# Altium footprint library Pcb-hionyPcbLib.PcbLib: 580 footprints (part 34 of 37)
Each footprint in its own frame and in the unit in brackets; x right, y up, seen from the top. Pads: shape width x height; smd on the part's side, far side on the other; paste and mask are expansions set on the pad; w line width, h text height; cw(c..) or ccw(c..) is an arc to the next point about the centre after c.
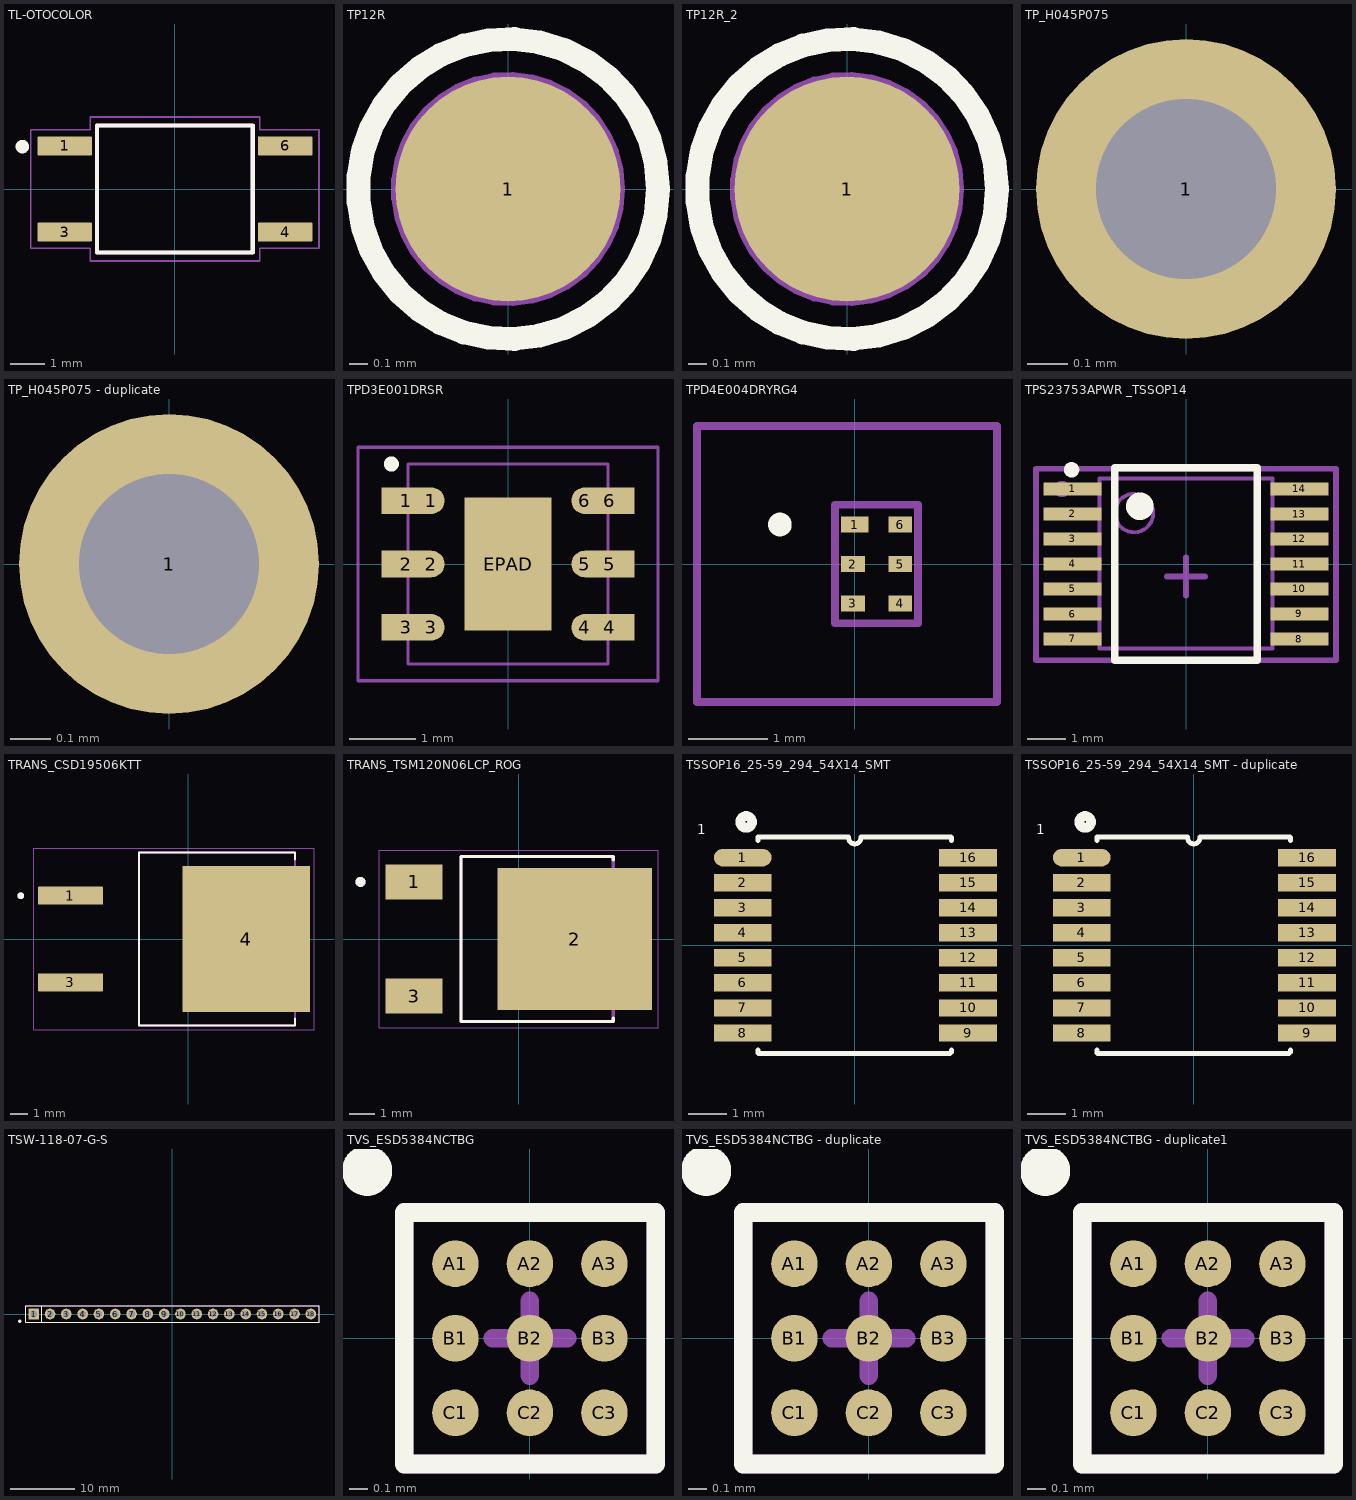
[diagram p33: the footprints below, top view; thin cyan lines are the x and y axes]

## TL-OTOCOLOR [mm]
pads (4):
  rrect14% 1.61x0.57 smd: 1(-3.25,1.27) 3(-3.25,-1.27) 4(3.25,-1.27) 6(3.25,1.27)
Top Overlay:
  circle w0.2: c-4.5,1.25 r0.1
  lines w0.127: -2.3,-1.875 2.3,-1.875 2.3,1.875 -2.3,1.875 -2.3,-1.875
Mechanical 13:
  circle w0.2: c-3.75,1.25 r0.1
  lines w0.127: -2.3,-1.875 2.3,-1.875 2.3,1.875 -2.3,1.875 -2.3,-1.875
Mechanical 15:
  lines w0.05: -4.25,-1.75 -2.5,-1.75 -2.5,-2.125 2.5,-2.125 2.5,-1.75 4.25,-1.75 4.25,1.75 2.5,1.75 2.5,2.125 -2.5,2.125 -2.5,1.75 -4.25,1.75 -4.25,-1.75
3D body "TLP185.step": height 2.2, standoff 0, extent -3.387,-1.9 3.641,1.9

## TP12R [mm]
pads (1):
  round 1.2 smd paste-10: 1(0,0)
Top Overlay:
  circle w0.127: c0,0 r0.8
Mechanical 11:
  text ".Designator" at 0,0 h0.5
Mechanical 13:
  circle w0.05: c0,0 r0.6
3D body: height 0.05, standoff 0, extent -0.6,-0.6 0.6,0.6

## TP12R_2 [mm]
pads (1):
  round 1.2 smd paste-10: 1(0,0)
Top Overlay:
  circle w0.127: c0,0 r0.8
Mechanical 11:
  text ".Designator" at 0.22,-0.575 h0.5
Mechanical 13:
  circle w0.05: c0,0 r0.6
3D body: height 0.05, standoff 0, extent -0.6,-0.6 0.6,0.6

## TP_H045P075 [mm]
pads (1):
  round 0.75 hole 0.45: 1(0,0)

## TP_H045P075 - duplicate [mm]
pads (1):
  round 0.75 hole 0.45: 1(0,0)

## TPD3E001DRSR [mm]
pads (13):
  rect 0.75x0.4 smd paste-0.025 mask+0.07: 1(-1.525,0.95) 2(-1.525,0) 3(-1.525,-0.95) 4(1.525,-0.95) 5(1.525,0) 6(1.525,0.95)
  round 0.4 smd paste-0.025 mask+0.07: 1(-1.15,0.95) 2(-1.15,0) 3(-1.15,-0.95) 4(1.15,-0.95) 5(1.15,0) 6(1.15,0.95)
  rect 1.3x2 smd paste-0.15 mask+0.05: EPAD(0,0)
Top Overlay:
  circle w0.127: c-1.75,1.5 r0.05
Mechanical 11:
  text ".Designator" at -1.27,0 h0.5
Mechanical 13:
  circle w0.05: c-1.15,0.95 r0.16
  lines w0.05: -1.5,-1.5 1.5,-1.5 1.5,1.5 -1.5,1.5 -1.5,-1.5
Mechanical 15:
  lines w0.05: -0.25,0 0.25,0 ; 0,-0.25 0,0.25 ; 0,-0.1 0,0.1 ; -2.25,-1.75 2.25,-1.75 2.25,1.75 -2.25,1.75 -2.25,-1.75
3D body "User Library-WSON-6.step": height 0.76, standoff 0.01, extent -1.51,-1.5 1.51,1.5

## TPD4E004DRYRG4 [mm]
pads (6):
  rect 0.35x0.2 smd: 1(0,0.5)
  rect 0.3x0.2 smd: 2(-0.025,0) 3(-0.025,-0.5) 4(0.575,-0.5) 5(0.575,0) 6(0.575,0.5)
Top Overlay:
  lines w0.2: -1,0.5 ccw(c-0.95,0.5) -0.9,0.5 ; -1,0.5 cw(c-0.95,0.5) -0.9,0.5 ; -1,0.5 ccw(c-0.95,0.5) -0.9,0.5
Mechanical 13:
  lines w0.1: -0.25,-0.75 -0.25,0.75 0.8,0.75 0.8,-0.75 -0.25,-0.75
Mechanical 15:
  lines w0.1: -2,-1.75 -2,1.75 1.8,1.75 1.8,-1.75 -2,-1.75
3D body "TPD4E004DRYRG4.stp": height 0.7, standoff 0, extent -0.25,-0.75 0.8,0.75

## TPS23753APWR _TSSOP14 [mm]
pads (14):
  rect 1.5x0.35 smd: 1(-2.95,1.95) 2(-2.95,1.3) 3(-2.95,0.65) 4(-2.95,0) 5(-2.95,-0.65) 6(-2.95,-1.3) 7(-2.95,-1.95) 8(2.95,-1.95) 9(2.95,-1.3) 10(2.95,-0.65) 11(2.95,0) 12(2.95,0.65) 13(2.95,1.3) 14(2.95,1.95)
Top Overlay:
  circle w0.25: c-2.975,2.45 r0.075
  circle w0.6: c-1.2,1.5 r0.056
  lines w0.2: -1.85,-2.5 -1.85,2.5 1.85,2.5 1.85,-2.5 -1.85,-2.5
Mechanical 13:
  circle w0.1: c-1.35,1.325 r0.5
  lines w0.1: -2.25,-2.2 -2.25,2.225 2.25,2.225 2.25,-2.2 -2.25,-2.2
Mechanical 15:
  circle w0.35: c-3.225,1.95 r0.035
  lines w0.15: -0.5,-0.325 0.5,-0.325 ; 0,-0.825 0,0.175 ; -3.9,-2.5 -3.9,2.475 3.9,2.475 3.9,-2.5 -3.9,-2.5
  text ".Designator" at -0.729,0.539 h0.55
3D body "User Library-TSSOP14-1.step": height 1.1, standoff 0, extent -3.2,-2.5 3.2,2.5

## TRANS_CSD19506KTT [mm]
height 4.7
pads (3):
  rrect10% 3.82x1.05 smd mask+0: 1(-6.9,2.54) 3(-6.9,-2.54)
  rect 7.48x8.55 smd paste-5 mask+0.07: 4(3.4,0)
Top Overlay:
  circle w0.2: c-9.81,2.54 r0.1
  lines w0.127: 6.265,-4.665 6.265,-5.08 -2.885,-5.08 -2.885,5.08 6.265,5.08 6.265,4.665
Top Paste:
  drawing of 42 lines, arcs and shapes, not listed
Top Solder:
  drawing of 2 lines, arcs and shapes, not listed
Mechanical 13:
  circle w0.2: c-9.81,2.54 r0.1
  lines w0.127: -2.885,-5.08 6.265,-5.08 6.265,5.08 -2.885,5.08 -2.885,-5.08
Mechanical 15:
  lines w0.05: -9.06,-5.33 -9.06,5.33 7.39,5.33 7.39,-5.33 -9.06,-5.33
3D body "CSD19506KTT.STEP": height 4.7, standoff -0.25, extent -7.607,-5.08 7.493,5.08

## TRANS_TSM120N06LCP_ROG [mm]
height 2.4
pads (3):
  rect 2.29x1.4 smd: 1(-4.19,2.285) 3(-4.19,-2.285)
  rect 6.18x5.69 smd paste-4: 2(2.245,0)
Top Overlay:
  circle w0.2: c-6.335,2.285 r0.1
  lines w0.127: 3.795,-3.165 3.795,-3.3 -2.305,-3.3 -2.305,3.3 3.795,3.3 3.795,3.165
Top Paste:
  region: 4.97,-2.305 3.64,-2.305 3.64,-0.545 4.97,-0.545
  region: 2.91,-2.305 1.58,-2.305 1.58,-0.545 2.91,-0.545
  region: 0.85,-2.305 -0.48,-2.305 -0.48,-0.545 0.85,-0.545
  region: 0.85,0.545 -0.48,0.545 -0.48,2.305 0.85,2.305
  region: 4.97,0.545 3.64,0.545 3.64,2.305 4.97,2.305
  region: 2.91,0.545 1.58,0.545 1.58,2.305 2.91,2.305
Mechanical 13:
  circle w0.2: c-6.335,2.285 r0.1
  lines w0.127: -2.305,-3.3 3.795,-3.3 3.795,3.3 -2.305,3.3 -2.305,-3.3
Mechanical 15:
  lines w0.05: -5.585,-3.55 5.585,-3.55 5.585,3.55 -5.585,3.55 -5.585,-3.55
3D body "step_temp.STEP": height 2.3, standoff -0.2, extent -5.05,-3.3 5.05,3.3

## TSSOP16_25-59_294_54X14_SMT [mm]
pads (16):
  oval 1.5x0.45 smd mask+0.076: 1(-2.908,2.273)
  rect 1.5x0.45 smd mask+0.076: 2(-2.908,1.623) 3(-2.908,0.973) 4(-2.908,0.323) 5(-2.908,-0.327) 6(-2.908,-0.977) 7(-2.908,-1.627) 8(-2.908,-2.277) 9(2.942,-2.277) 10(2.942,-1.627) 11(2.942,-0.977) 12(2.942,-0.327) 13(2.942,0.323) 14(2.942,0.973) 15(2.942,1.623) 16(2.942,2.273)
Top Overlay:
  circle w0.254: c-2.819,3.2 r0.152
  lines w0.127: -2.515,-2.718 -2.515,-2.794 -2.502,-2.807 2.477,-2.807 2.515,-2.769 2.515,-2.718 ; -2.515,2.718 -2.515,2.794 ; -2.515,2.807 -0.164,2.807 ; -0.162,2.796 ccw(c0,2.794) 0.163,2.794 ; 0.164,2.807 2.502,2.807 2.515,2.794 2.515,2.718
  text "1" at -4.094,2.882 h0.25
3D body "TSSOP-16 5_1x4_4.STEP": height 1.2, standoff 0.1, extent -3.2,-2.55 3.2,2.55

## TSSOP16_25-59_294_54X14_SMT - duplicate [mm]
pads (16):
  oval 1.5x0.45 smd mask+0.076: 1(-2.908,2.273)
  rect 1.5x0.45 smd mask+0.076: 2(-2.908,1.623) 3(-2.908,0.973) 4(-2.908,0.323) 5(-2.908,-0.327) 6(-2.908,-0.977) 7(-2.908,-1.627) 8(-2.908,-2.277) 9(2.942,-2.277) 10(2.942,-1.627) 11(2.942,-0.977) 12(2.942,-0.327) 13(2.942,0.323) 14(2.942,0.973) 15(2.942,1.623) 16(2.942,2.273)
Top Overlay:
  circle w0.254: c-2.819,3.2 r0.152
  lines w0.127: -2.515,-2.718 -2.515,-2.794 -2.502,-2.807 2.477,-2.807 2.515,-2.769 2.515,-2.718 ; -2.515,2.718 -2.515,2.794 ; -2.515,2.807 -0.164,2.807 ; -0.162,2.796 ccw(c0,2.794) 0.163,2.794 ; 0.164,2.807 2.502,2.807 2.515,2.794 2.515,2.718
  text "1" at -4.094,2.882 h0.25
3D body "TSSOP-16 5_1x4_4.STEP": height 1.2, standoff 0.1, extent -3.2,-2.55 3.2,2.55

## TSW-118-07-G-S [mm]
pads (18):
  rect 1.65x1.65 hole 1.016 mask+0: 1(-21.59,0)
  round 1.65 hole 1.016 mask+0: 2(-19.05,0) 3(-16.51,0) 4(-13.97,0) 5(-11.43,0) 6(-8.89,0) 7(-6.35,0) 8(-3.81,0) 9(-1.27,0) 10(1.27,0) 11(3.81,0) 12(6.35,0) 13(8.89,0) 14(11.43,0) 15(13.97,0) 16(16.51,0) 17(19.05,0) 18(21.59,0)
Top Overlay:
  circle w0.25: c-23.76,-1.13 r0.125
  lines w0.178: -20.32,-1.27 -20.32,1.27 ; -22.86,-1.27 22.86,-1.27 22.86,1.27 -22.86,1.27 -22.86,-1.27
Top 3D Body:
  rectangle: -22.098,-0.508 -21.082,0.508
  lines w0.127: -22.86,-1.27 -22.86,1.27 22.86,1.27 22.86,-1.27 -22.86,-1.27
  text ".Designator" at -1.524,-0.508 h1.02
3D body "SamtecTSW-07_18x1.stp": height 8.38, standoff -2.54, extent -22.86,-1.27 22.86,1.27

## TVS_ESD5384NCTBG [mm]
pads (9):
  round 0.25 smd mask+0.05: A1(-0.4,0.4) A2(0,0.4) A3(0.4,0.4) B1(-0.4,0) B2(0,0) B3(0.4,0) C1(-0.4,-0.4) C2(0,-0.4) C3(0.4,-0.4)
Top Overlay:
  circle w0.2: c-0.875,0.9 r0.035
  lines w0.1: -0.675,-0.675 0.675,-0.675 0.675,0.675 -0.675,0.675 -0.675,-0.675
Top Solder:
  region: -0.575,0.575 -0.575,-0.575 0.575,-0.575 0.575,0.575
Mechanical 15:
  lines w0.1: -0.2,0 0,0 ; 0,-0.2 0,0 ; 0,0.2 0,0 ; 0.2,0 0,0 ; -0.675,-0.675 0.675,-0.675 0.675,0.675 -0.675,0.675 -0.675,-0.675
  text "C3" at 0.05,-0.575 h0.25
  text ".Designator" at -0.5,2.325 h0.55
  text "A1" at -0.525,-0.05 h0.25
3D body: height 0.57, standoff 0, extent -0.57,-0.57 0.57,0.57
3D body: height 0.58, standoff 0, extent -0.5,0.3 -0.3,0.5

## TVS_ESD5384NCTBG - duplicate [mm]
pads (9):
  round 0.25 smd mask+0.05: A1(-0.4,0.4) A2(0,0.4) A3(0.4,0.4) B1(-0.4,0) B2(0,0) B3(0.4,0) C1(-0.4,-0.4) C2(0,-0.4) C3(0.4,-0.4)
Top Overlay:
  circle w0.2: c-0.875,0.9 r0.035
  lines w0.1: -0.675,-0.675 -0.675,0.675 0.675,0.675 0.675,-0.675 -0.675,-0.675
Top Solder:
  region: -0.575,0.575 -0.575,-0.575 0.575,-0.575 0.575,0.575
Mechanical 15:
  lines w0.1: -0.2,0 0,0 ; 0,-0.2 0,0 ; 0,0.2 0,0 ; 0.2,0 0,0 ; -0.675,-0.675 -0.675,0.675 0.675,0.675 0.675,-0.675 -0.675,-0.675
  text ".Designator" at -0.5,2.325 h0.55
  text "C3" at 0.05,-0.575 h0.25
  text "A1" at -0.525,-0.05 h0.25
3D body: height 0.58, standoff 0, extent -0.5,0.3 -0.3,0.5
3D body: height 0.57, standoff 0, extent -0.57,-0.57 0.57,0.57

## TVS_ESD5384NCTBG - duplicate1 [mm]
pads (9):
  round 0.25 smd mask+0.05: A1(-0.4,0.4) A2(0,0.4) A3(0.4,0.4) B1(-0.4,0) B2(0,0) B3(0.4,0) C1(-0.4,-0.4) C2(0,-0.4) C3(0.4,-0.4)
Top Overlay:
  circle w0.2: c-0.875,0.9 r0.035
  lines w0.1: -0.675,-0.675 0.675,-0.675 0.675,0.675 -0.675,0.675 -0.675,-0.675
Top Solder:
  region: -0.575,0.575 -0.575,-0.575 0.575,-0.575 0.575,0.575
Mechanical 15:
  lines w0.1: -0.2,0 0,0 ; 0,-0.2 0,0 ; 0,0.2 0,0 ; 0.2,0 0,0 ; -0.675,-0.675 0.675,-0.675 0.675,0.675 -0.675,0.675 -0.675,-0.675
  text "A1" at -0.525,-0.05 h0.25
  text "C3" at 0.05,-0.575 h0.25
  text ".Designator" at -0.5,2.325 h0.55
3D body: height 0.57, standoff 0, extent -0.57,-0.57 0.57,0.57
3D body: height 0.58, standoff 0, extent -0.5,0.3 -0.3,0.5